# Altium integrated library Samtec 2 mm Pitch Terminal Strips.IntLib: 623 symbols (part 3 of 5) (continued)
## TMMH-136-01-L-D-ES
designator P?
Flexible Through-Hole Header, Vertical, -55 to 125 degC, 2 mm Pitch, 72-Pin, Male, RoHS; Manufacturer: Samtec; PartNumber: TMMH-136-01-L-D-ES; Pitch: 2 mm; DatasheetVersion: F-214; PackageVersion: AR, 12/1996; PackageReference: TMMH-136-01-X-D-ES; PackageDescription: 2mm x 2mm Terminal Strip Assembly; Orientation: Vertical; RoHS: True; Temperature Range: -55 to 125 degC; Mounting Technology: Through-hole; ComponentLink1Description: Manufacturer URL; ComponentLink1URL: http://www.samtec.com; ComponentLink2Description: Datasheet; ComponentLink2URL: http://d2a072wq521u33.cloudfront.net/catalog_english//TMMH_TH.PDF; ComponentLink3Description: Package Specification; ComponentLink3URL: http://www.samtec.com/documents/webfiles/cpdf/TMMH-1XX-XX-XX-D-XXX-XXX-MKT1.pdf
footprint SMTC-TMMH-136-01-X-D-ES (Terminal Strip Assembly, 2x36 Pins, Vertical, 2mm Pitch, Male)
pins: 1, 2, 3, 4, 5, 6, 7, 8, 9, 10, 11, 12, 13, 14, 15, 16, 17, 18, 19, 20, 21, 22, 23, 24, 25, 26, 27, 28, 29, 30, 31, 32, 33, 34, 35, 36, 37, 38, 39, 40, 41, 42, 43, 44, 45, 46, 47, 48, 49, 50, 51, 52, 53, 54, 55, 56, 57, 58, 59, 60, 61, 62, 63, 64, 65, 66, 67, 68, 69, 70, 71, 72

## TMMH-136-01-T-D-ES
designator P?
Flexible Through-Hole Header, Vertical, -55 to 105 degC, 2 mm Pitch, 72-Pin, Male, RoHS; Manufacturer: Samtec; PartNumber: TMMH-136-01-T-D-ES; Pitch: 2 mm; DatasheetVersion: F-214; PackageVersion: AR, 12/1996; PackageReference: TMMH-136-01-X-D-ES; PackageDescription: 2mm x 2mm Terminal Strip Assembly; Orientation: Vertical; RoHS: True; Temperature Range: -55 to 105 degC; Mounting Technology: Through-hole; ComponentLink1Description: Manufacturer URL; ComponentLink1URL: http://www.samtec.com; ComponentLink2Description: Datasheet; ComponentLink2URL: http://d2a072wq521u33.cloudfront.net/catalog_english//TMMH_TH.PDF; ComponentLink3Description: Package Specification; ComponentLink3URL: http://www.samtec.com/documents/webfiles/cpdf/TMMH-1XX-XX-XX-D-XXX-XXX-MKT1.pdf
footprint SMTC-TMMH-136-01-X-D-ES (Terminal Strip Assembly, 2x36 Pins, Vertical, 2mm Pitch, Male)
pins: 1, 2, 3, 4, 5, 6, 7, 8, 9, 10, 11, 12, 13, 14, 15, 16, 17, 18, 19, 20, 21, 22, 23, 24, 25, 26, 27, 28, 29, 30, 31, 32, 33, 34, 35, 36, 37, 38, 39, 40, 41, 42, 43, 44, 45, 46, 47, 48, 49, 50, 51, 52, 53, 54, 55, 56, 57, 58, 59, 60, 61, 62, 63, 64, 65, 66, 67, 68, 69, 70, 71, 72

## TMMS-105-01-F-Q-RA-FS
designator P?
Shrouded Header, Through-Hole, Right Angle, -55 to 125 degC, 2 mm Pitch, 20-Pin, Male, RoHS; Manufacturer: Samtec; PartNumber: TMMS-105-01-F-Q-RA-FS; Pitch: 2 mm; DatasheetVersion: F-214; PackageVersion: G, 12/2002; PackageReference: TMMS-105-01-X-Q-RA-FS; PackageDescription: 2mm Quad Row Full Shroud Terminal ASM; Supplier 1: Newark; Supplier Part Number 1: 76P8860; Orientation: Right Angle; RoHS: True; Temperature Range: -55 to 125 degC; Mounting Technology: Through-hole; ComponentLink1Description: Manufacturer URL; ComponentLink1URL: http://www.samtec.com; ComponentLink2Description: Datasheet; ComponentLink2URL: http://d2a072wq521u33.cloudfront.net/catalog_english//tmms.pdf; ComponentLink3Description: Package Specification; ComponentLink3URL: http://www.samtec.com/documents/webfiles/cpdf/tmms-1xx-xx-xx-q-xx-fs-mkt.pdf
footprint SMTC-TMMS-105-01-X-Q-RA-FS (Full Shroud Terminal ASM, 4x5 Pins, Right Angle, 2mm Pitch, Male)
pins: 1, 2, 3, 4, 5, 6, 7, 8, 9, 10, 11, 12, 13, 14, 15, 16, 17, 18, 19, 20

## TMMS-105-01-L-Q-RA-FS
designator P?
Shrouded Header, Through-Hole, Right Angle, -55 to 125 degC, 2 mm Pitch, 20-Pin, Male, RoHS; Manufacturer: Samtec; PartNumber: TMMS-105-01-L-Q-RA-FS; Pitch: 2 mm; DatasheetVersion: F-214; PackageVersion: G, 12/2002; PackageReference: TMMS-105-01-X-Q-RA-FS; PackageDescription: 2mm Quad Row Full Shroud Terminal ASM; Supplier 1: Newark; Supplier Part Number 1: 76P8869; Orientation: Right Angle; RoHS: True; Temperature Range: -55 to 125 degC; Mounting Technology: Through-hole; ComponentLink1Description: Manufacturer URL; ComponentLink1URL: http://www.samtec.com; ComponentLink2Description: Datasheet; ComponentLink2URL: http://d2a072wq521u33.cloudfront.net/catalog_english//tmms.pdf; ComponentLink3Description: Package Specification; ComponentLink3URL: http://www.samtec.com/documents/webfiles/cpdf/tmms-1xx-xx-xx-q-xx-fs-mkt.pdf
footprint SMTC-TMMS-105-01-X-Q-RA-FS (Full Shroud Terminal ASM, 4x5 Pins, Right Angle, 2mm Pitch, Male)
pins: 1, 2, 3, 4, 5, 6, 7, 8, 9, 10, 11, 12, 13, 14, 15, 16, 17, 18, 19, 20

## TMMS-110-01-F-Q-FS
designator P?
Shrouded Header, Through-Hole, Vertical, -55 to 125 degC, 2 mm Pitch, 40-Pin, Male, RoHS; Manufacturer: Samtec; PartNumber: TMMS-110-01-F-Q-FS; Pitch: 2 mm; DatasheetVersion: F-214; PackageVersion: G, 12/2002; PackageReference: TMMS-110-01-X-Q-FS; PackageDescription: 2mm Quad Row Full Shroud Terminal ASM; Supplier 1: Newark; Supplier Part Number 1: 76P8895; Orientation: Vertical; RoHS: True; Temperature Range: -55 to 125 degC; Mounting Technology: Through-hole; ComponentLink1Description: Manufacturer URL; ComponentLink1URL: http://www.samtec.com; ComponentLink2Description: Datasheet; ComponentLink2URL: http://d2a072wq521u33.cloudfront.net/catalog_english//tmms.pdf; ComponentLink3Description: Package Specification; ComponentLink3URL: http://www.samtec.com/documents/webfiles/cpdf/tmms-1xx-xx-xx-q-xx-fs-mkt.pdf
footprint SMTC-TMMS-110-01-X-Q-FS (Full Shroud Terminal ASM, 4x10 Pins, Vertical, 2mm Pitch, Male)
pins: 1, 2, 3, 4, 5, 6, 7, 8, 9, 10, 11, 12, 13, 14, 15, 16, 17, 18, 19, 20, 21, 22, 23, 24, 25, 26, 27, 28, 29, 30, 31, 32, 33, 34, 35, 36, 37, 38, 39, 40

## TMMS-110-01-F-Q-RA
designator P?
Shrouded Header, Through-Hole, Right Angle, -55 to 125 degC, 2 mm Pitch, 40-Pin, Male, RoHS; Manufacturer: Samtec; PartNumber: TMMS-110-01-F-Q-RA; Pitch: 2 mm; DatasheetVersion: F-214; PackageVersion: G, 12/2002; PackageReference: TMMS-110-01-X-Q-RA; PackageDescription: 2mm Quad Row Full Shroud Terminal ASM; Supplier 1: Newark; Supplier Part Number 1: 76P8896; Orientation: Right Angle; RoHS: True; Temperature Range: -55 to 125 degC; Mounting Technology: Through-hole; ComponentLink1Description: Manufacturer URL; ComponentLink1URL: http://www.samtec.com; ComponentLink2Description: Datasheet; ComponentLink2URL: http://d2a072wq521u33.cloudfront.net/catalog_english//tmms.pdf; ComponentLink3Description: Package Specification; ComponentLink3URL: http://www.samtec.com/documents/webfiles/cpdf/tmms-1xx-xx-xx-q-xx-fs-mkt.pdf
footprint SMTC-TMMS-110-01-X-Q-RA (Full Shroud Terminal ASM, 4x10 Pins, Right Angle, 2mm Pitch, Male)
pins: 1, 2, 3, 4, 5, 6, 7, 8, 9, 10, 11, 12, 13, 14, 15, 16, 17, 18, 19, 20, 21, 22, 23, 24, 25, 26, 27, 28, 29, 30, 31, 32, 33, 34, 35, 36, 37, 38, 39, 40

## TMMS-110-01-L-Q-FS
designator P?
Shrouded Header, Through-Hole, Vertical, -55 to 125 degC, 2 mm Pitch, 40-Pin, Male, RoHS; Manufacturer: Samtec; PartNumber: TMMS-110-01-L-Q-FS; Pitch: 2 mm; DatasheetVersion: F-214; PackageVersion: G, 12/2002; PackageReference: TMMS-110-01-X-Q-FS; PackageDescription: 2mm Quad Row Full Shroud Terminal ASM; Supplier 1: Newark; Supplier Part Number 1: 76P8903; Orientation: Vertical; RoHS: True; Temperature Range: -55 to 125 degC; Mounting Technology: Through-hole; ComponentLink1Description: Manufacturer URL; ComponentLink1URL: http://www.samtec.com; ComponentLink2Description: Datasheet; ComponentLink2URL: http://d2a072wq521u33.cloudfront.net/catalog_english//tmms.pdf; ComponentLink3Description: Package Specification; ComponentLink3URL: http://www.samtec.com/documents/webfiles/cpdf/tmms-1xx-xx-xx-q-xx-fs-mkt.pdf
footprint SMTC-TMMS-110-01-X-Q-FS (Full Shroud Terminal ASM, 4x10 Pins, Vertical, 2mm Pitch, Male)
pins: 1, 2, 3, 4, 5, 6, 7, 8, 9, 10, 11, 12, 13, 14, 15, 16, 17, 18, 19, 20, 21, 22, 23, 24, 25, 26, 27, 28, 29, 30, 31, 32, 33, 34, 35, 36, 37, 38, 39, 40

## TMMS-110-01-L-Q-RA
designator P?
Shrouded Header, Through-Hole, Right Angle, -55 to 125 degC, 2 mm Pitch, 40-Pin, Male, RoHS; Manufacturer: Samtec; PartNumber: TMMS-110-01-L-Q-RA; Pitch: 2 mm; DatasheetVersion: F-214; PackageVersion: G, 12/2002; PackageReference: TMMS-110-01-X-Q-RA; PackageDescription: 2mm Quad Row Full Shroud Terminal ASM; Supplier 1: Newark; Supplier Part Number 1: 76P8904; Orientation: Right Angle; RoHS: True; Temperature Range: -55 to 125 degC; Mounting Technology: Through-hole; ComponentLink1Description: Manufacturer URL; ComponentLink1URL: http://www.samtec.com; ComponentLink2Description: Datasheet; ComponentLink2URL: http://d2a072wq521u33.cloudfront.net/catalog_english//tmms.pdf; ComponentLink3Description: Package Specification; ComponentLink3URL: http://www.samtec.com/documents/webfiles/cpdf/tmms-1xx-xx-xx-q-xx-fs-mkt.pdf
footprint SMTC-TMMS-110-01-X-Q-RA (Full Shroud Terminal ASM, 4x10 Pins, Right Angle, 2mm Pitch, Male)
pins: 1, 2, 3, 4, 5, 6, 7, 8, 9, 10, 11, 12, 13, 14, 15, 16, 17, 18, 19, 20, 21, 22, 23, 24, 25, 26, 27, 28, 29, 30, 31, 32, 33, 34, 35, 36, 37, 38, 39, 40

## TMMS-111-01-F-Q-FS
designator P?
Shrouded Header, Through-Hole, Vertical, -55 to 125 degC, 2 mm Pitch, 44-Pin, Male, RoHS; Manufacturer: Samtec; PartNumber: TMMS-111-01-F-Q-FS; Pitch: 2 mm; DatasheetVersion: F-214; PackageVersion: G, 12/2002; PackageReference: TMMS-111-01-X-Q-FS; PackageDescription: 2mm Quad Row Full Shroud Terminal ASM; Orientation: Vertical; RoHS: True; Temperature Range: -55 to 125 degC; Mounting Technology: Through-hole; ComponentLink1Description: Manufacturer URL; ComponentLink1URL: http://www.samtec.com; ComponentLink2Description: Datasheet; ComponentLink2URL: http://d2a072wq521u33.cloudfront.net/catalog_english//tmms.pdf; ComponentLink3Description: Package Specification; ComponentLink3URL: http://www.samtec.com/documents/webfiles/cpdf/tmms-1xx-xx-xx-q-xx-fs-mkt.pdf
footprint SMTC-TMMS-111-01-X-Q-FS (Full Shroud Terminal ASM, 4x11 Pins, Vertical, 2mm Pitch, Male)
pins: 1, 2, 3, 4, 5, 6, 7, 8, 9, 10, 11, 12, 13, 14, 15, 16, 17, 18, 19, 20, 21, 22, 23, 24, 25, 26, 27, 28, 29, 30, 31, 32, 33, 34, 35, 36, 37, 38, 39, 40, 41, 42, 43, 44

## TMMS-111-01-L-Q-FS
designator P?
Shrouded Header, Through-Hole, Vertical, -55 to 125 degC, 2 mm Pitch, 44-Pin, Male, RoHS; Manufacturer: Samtec; PartNumber: TMMS-111-01-L-Q-FS; Pitch: 2 mm; DatasheetVersion: F-214; PackageVersion: G, 12/2002; PackageReference: TMMS-111-01-X-Q-FS; PackageDescription: 2mm Quad Row Full Shroud Terminal ASM; Orientation: Vertical; RoHS: True; Temperature Range: -55 to 125 degC; Mounting Technology: Through-hole; ComponentLink1Description: Manufacturer URL; ComponentLink1URL: http://www.samtec.com; ComponentLink2Description: Datasheet; ComponentLink2URL: http://d2a072wq521u33.cloudfront.net/catalog_english//tmms.pdf; ComponentLink3Description: Package Specification; ComponentLink3URL: http://www.samtec.com/documents/webfiles/cpdf/tmms-1xx-xx-xx-q-xx-fs-mkt.pdf
footprint SMTC-TMMS-111-01-X-Q-FS (Full Shroud Terminal ASM, 4x11 Pins, Vertical, 2mm Pitch, Male)
pins: 1, 2, 3, 4, 5, 6, 7, 8, 9, 10, 11, 12, 13, 14, 15, 16, 17, 18, 19, 20, 21, 22, 23, 24, 25, 26, 27, 28, 29, 30, 31, 32, 33, 34, 35, 36, 37, 38, 39, 40, 41, 42, 43, 44

## TMMS-125-01-F-Q-FS
designator P?
Shrouded Header, Through-Hole, Vertical, -55 to 125 degC, 2 mm Pitch, 100-Pin, Male, RoHS; Manufacturer: Samtec; PartNumber: TMMS-125-01-F-Q-FS; Pitch: 2 mm; DatasheetVersion: F-214; PackageVersion: G, 12/2002; PackageReference: TMMS-125-01-X-Q-FS; PackageDescription: 2mm Quad Row Full Shroud Terminal ASM; Orientation: Vertical; RoHS: True; Temperature Range: -55 to 125 degC; Mounting Technology: Through-hole; ComponentLink1Description: Manufacturer URL; ComponentLink1URL: http://www.samtec.com; ComponentLink2Description: Datasheet; ComponentLink2URL: http://d2a072wq521u33.cloudfront.net/catalog_english//tmms.pdf; ComponentLink3Description: Package Specification; ComponentLink3URL: http://www.samtec.com/documents/webfiles/cpdf/tmms-1xx-xx-xx-q-xx-fs-mkt.pdf
footprint SMTC-TMMS-125-01-X-Q-FS (Full Shroud Terminal ASM, 4x25 Pins, Vertical, 2mm Pitch, Male)
pins: 1, 2, 3, 4, 5, 6, 7, 8, 9, 10, 11, 12, 13, 14, 15, 16, 17, 18, 19, 20, 21, 22, 23, 24, 25, 26, 27, 28, 29, 30, 31, 32, 33, 34, 35, 36, 37, 38, 39, 40, 41, 42, 43, 44, 45, 46, 47, 48, 49, 50, 51, 52, 53, 54, 55, 56, 57, 58, 59, 60, 61, 62, 63, 64, 65, 66, 67, 68, 69, 70, 71, 72, 73, 74, 75, 76, 77, 78, 79, 80, 81, 82, 83, 84, 85, 86, 87, 88, 89, 90, 91, 92, 93, 94, 95, 96, 97, 98, 99, 100

## TMMS-125-01-F-Q-RA-FS
designator P?
Shrouded Header, Through-Hole, Right Angle, -55 to 125 degC, 2 mm Pitch, 100-Pin, Male, RoHS; Manufacturer: Samtec; PartNumber: TMMS-125-01-F-Q-RA-FS; Pitch: 2 mm; DatasheetVersion: F-214; PackageVersion: G, 12/2002; PackageReference: TMMS-125-01-X-Q-RA-FS; PackageDescription: 2mm Quad Row Full Shroud Terminal ASM; Orientation: Right Angle; RoHS: True; Temperature Range: -55 to 125 degC; Mounting Technology: Through-hole; ComponentLink1Description: Manufacturer URL; ComponentLink1URL: http://www.samtec.com; ComponentLink2Description: Datasheet; ComponentLink2URL: http://d2a072wq521u33.cloudfront.net/catalog_english//tmms.pdf; ComponentLink3Description: Package Specification; ComponentLink3URL: http://www.samtec.com/documents/webfiles/cpdf/tmms-1xx-xx-xx-q-xx-fs-mkt.pdf
footprint SMTC-TMMS-125-01-X-Q-RA-FS (Full Shroud Terminal ASM, 4x25 Pins, Right Angle, 2mm Pitch, Male)
pins: 1, 2, 3, 4, 5, 6, 7, 8, 9, 10, 11, 12, 13, 14, 15, 16, 17, 18, 19, 20, 21, 22, 23, 24, 25, 26, 27, 28, 29, 30, 31, 32, 33, 34, 35, 36, 37, 38, 39, 40, 41, 42, 43, 44, 45, 46, 47, 48, 49, 50, 51, 52, 53, 54, 55, 56, 57, 58, 59, 60, 61, 62, 63, 64, 65, 66, 67, 68, 69, 70, 71, 72, 73, 74, 75, 76, 77, 78, 79, 80, 81, 82, 83, 84, 85, 86, 87, 88, 89, 90, 91, 92, 93, 94, 95, 96, 97, 98, 99, 100

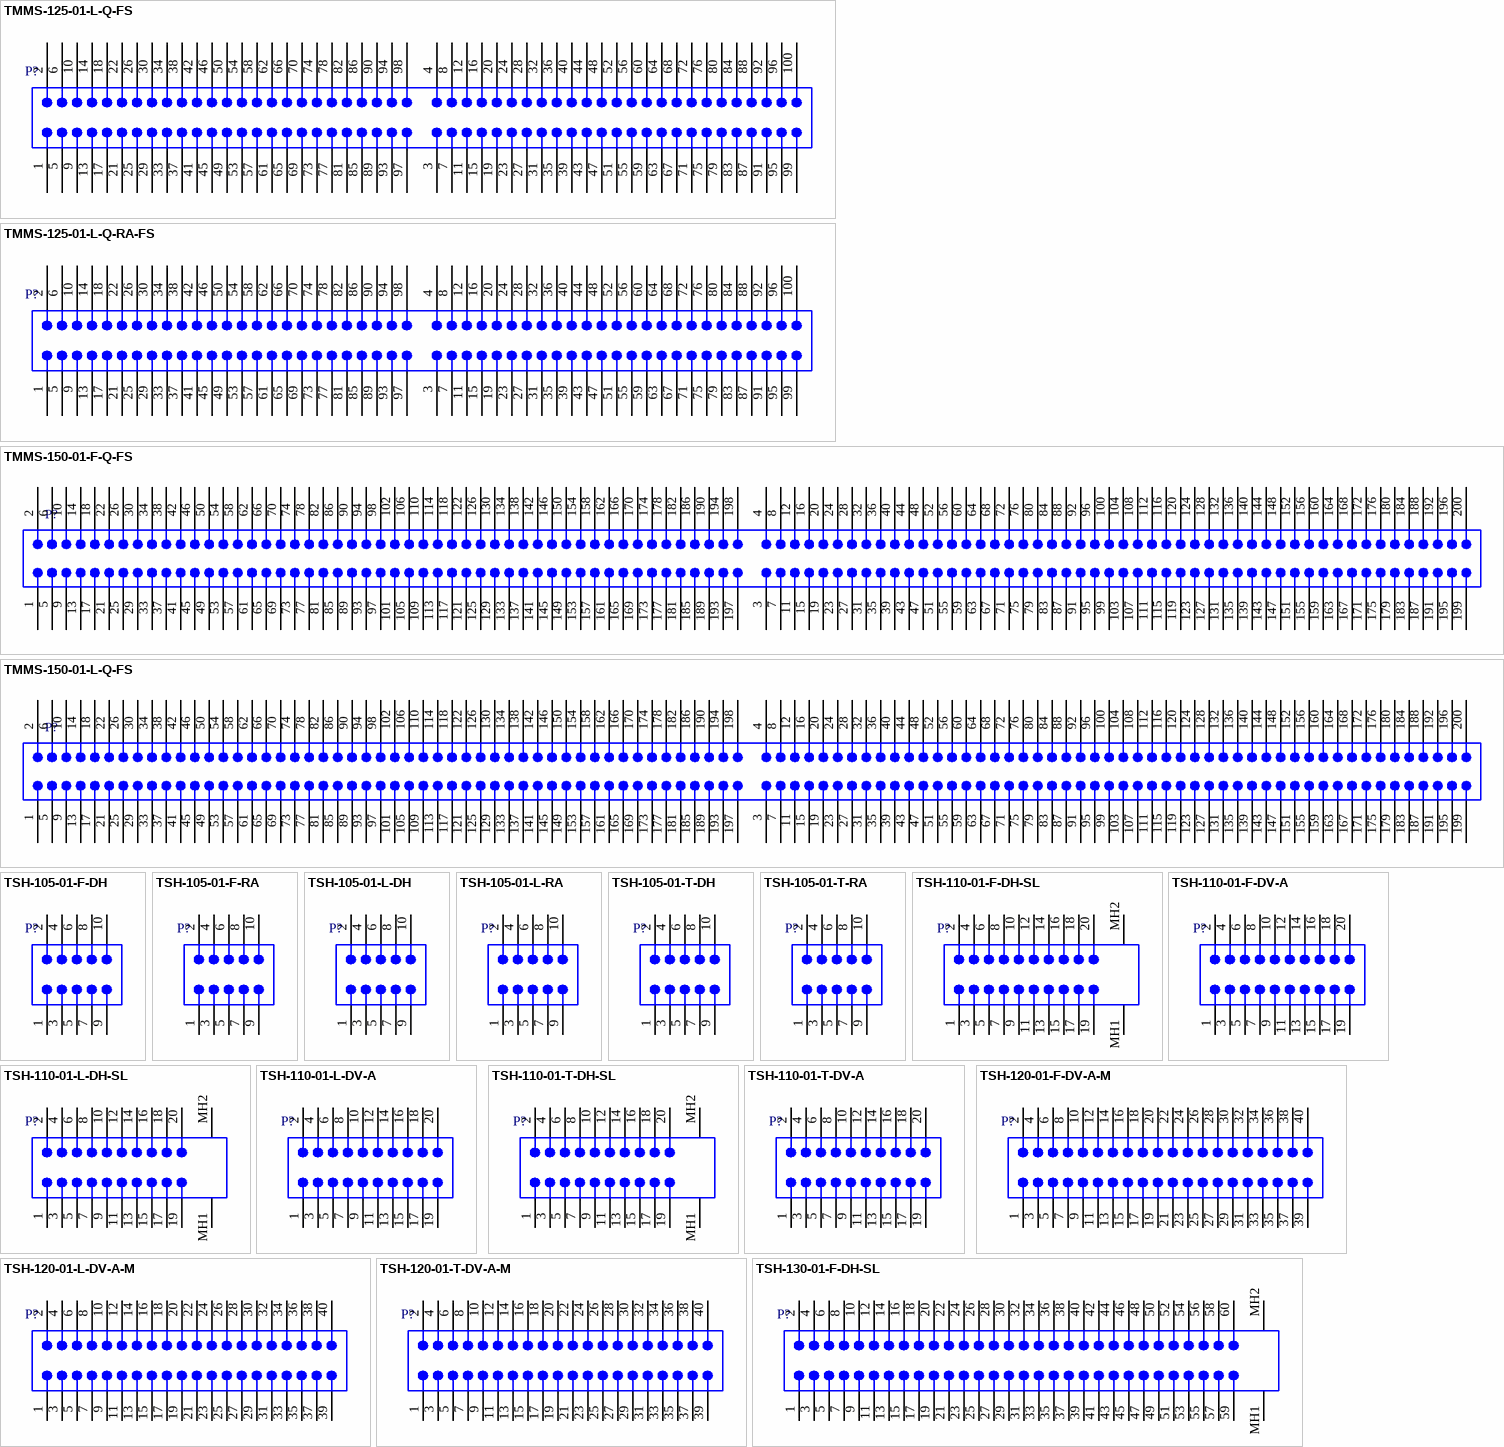
[diagram p8: symbols TMMS-125-01-L-Q-FS to TSH-130-01-F-DH-SL]

## TMMS-125-01-L-Q-FS
designator P?
Shrouded Header, Through-Hole, Vertical, -55 to 125 degC, 2 mm Pitch, 100-Pin, Male, RoHS; Manufacturer: Samtec; PartNumber: TMMS-125-01-L-Q-FS; Pitch: 2 mm; DatasheetVersion: F-214; PackageVersion: G, 12/2002; PackageReference: TMMS-125-01-X-Q-FS; PackageDescription: 2mm Quad Row Full Shroud Terminal ASM; Orientation: Vertical; RoHS: True; Temperature Range: -55 to 125 degC; Mounting Technology: Through-hole; ComponentLink1Description: Manufacturer URL; ComponentLink1URL: http://www.samtec.com; ComponentLink2Description: Datasheet; ComponentLink2URL: http://d2a072wq521u33.cloudfront.net/catalog_english//tmms.pdf; ComponentLink3Description: Package Specification; ComponentLink3URL: http://www.samtec.com/documents/webfiles/cpdf/tmms-1xx-xx-xx-q-xx-fs-mkt.pdf
footprint SMTC-TMMS-125-01-X-Q-FS (Full Shroud Terminal ASM, 4x25 Pins, Vertical, 2mm Pitch, Male)
pins: 1, 2, 3, 4, 5, 6, 7, 8, 9, 10, 11, 12, 13, 14, 15, 16, 17, 18, 19, 20, 21, 22, 23, 24, 25, 26, 27, 28, 29, 30, 31, 32, 33, 34, 35, 36, 37, 38, 39, 40, 41, 42, 43, 44, 45, 46, 47, 48, 49, 50, 51, 52, 53, 54, 55, 56, 57, 58, 59, 60, 61, 62, 63, 64, 65, 66, 67, 68, 69, 70, 71, 72, 73, 74, 75, 76, 77, 78, 79, 80, 81, 82, 83, 84, 85, 86, 87, 88, 89, 90, 91, 92, 93, 94, 95, 96, 97, 98, 99, 100

## TMMS-125-01-L-Q-RA-FS
designator P?
Shrouded Header, Through-Hole, Right Angle, -55 to 125 degC, 2 mm Pitch, 100-Pin, Male, RoHS; Manufacturer: Samtec; PartNumber: TMMS-125-01-L-Q-RA-FS; Pitch: 2 mm; DatasheetVersion: F-214; PackageVersion: G, 12/2002; PackageReference: TMMS-125-01-X-Q-RA-FS; PackageDescription: 2mm Quad Row Full Shroud Terminal ASM; Orientation: Right Angle; RoHS: True; Temperature Range: -55 to 125 degC; Mounting Technology: Through-hole; ComponentLink1Description: Manufacturer URL; ComponentLink1URL: http://www.samtec.com; ComponentLink2Description: Datasheet; ComponentLink2URL: http://d2a072wq521u33.cloudfront.net/catalog_english//tmms.pdf; ComponentLink3Description: Package Specification; ComponentLink3URL: http://www.samtec.com/documents/webfiles/cpdf/tmms-1xx-xx-xx-q-xx-fs-mkt.pdf
footprint SMTC-TMMS-125-01-X-Q-RA-FS (Full Shroud Terminal ASM, 4x25 Pins, Right Angle, 2mm Pitch, Male)
pins: 1, 2, 3, 4, 5, 6, 7, 8, 9, 10, 11, 12, 13, 14, 15, 16, 17, 18, 19, 20, 21, 22, 23, 24, 25, 26, 27, 28, 29, 30, 31, 32, 33, 34, 35, 36, 37, 38, 39, 40, 41, 42, 43, 44, 45, 46, 47, 48, 49, 50, 51, 52, 53, 54, 55, 56, 57, 58, 59, 60, 61, 62, 63, 64, 65, 66, 67, 68, 69, 70, 71, 72, 73, 74, 75, 76, 77, 78, 79, 80, 81, 82, 83, 84, 85, 86, 87, 88, 89, 90, 91, 92, 93, 94, 95, 96, 97, 98, 99, 100

## TMMS-150-01-F-Q-FS
designator P?
Shrouded Header, Through-Hole, Vertical, -55 to 125 degC, 2 mm Pitch, 200-Pin, Male, RoHS; Manufacturer: Samtec; PartNumber: TMMS-150-01-F-Q-FS; Pitch: 2 mm; DatasheetVersion: F-214; PackageVersion: G, 12/2002; PackageReference: TMMS-150-01-X-Q-FS; PackageDescription: 2mm Quad Row Full Shroud Terminal ASM; Supplier 1: Newark; Supplier Part Number 1: 76P9065; Orientation: Vertical; RoHS: True; Temperature Range: -55 to 125 degC; Mounting Technology: Through-hole; ComponentLink1Description: Manufacturer URL; ComponentLink1URL: http://www.samtec.com; ComponentLink2Description: Datasheet; ComponentLink2URL: http://d2a072wq521u33.cloudfront.net/catalog_english//tmms.pdf; ComponentLink3Description: Package Specification; ComponentLink3URL: http://www.samtec.com/documents/webfiles/cpdf/tmms-1xx-xx-xx-q-xx-fs-mkt.pdf
footprint SMTC-TMMS-150-01-X-Q-FS (Full Shroud Terminal ASM, 4x50 Pins, Vertical, 2mm Pitch, Male)
pins: 1, 2, 3, 4, 5, 6, 7, 8, 9, 10, 11, 12, 13, 14, 15, 16, 17, 18, 19, 20, 21, 22, 23, 24, 25, 26, 27, 28, 29, 30, 31, 32, 33, 34, 35, 36, 37, 38, 39, 40, 41, 42, 43, 44, 45, 46, 47, 48, 49, 50, 51, 52, 53, 54, 55, 56, 57, 58, 59, 60, 61, 62, 63, 64, 65, 66, 67, 68, 69, 70, 71, 72, 73, 74, 75, 76, 77, 78, 79, 80, 81, 82, 83, 84, 85, 86, 87, 88, 89, 90, 91, 92, 93, 94, 95, 96, 97, 98, 99, 100, 101, 102, 103, 104, 105, 106, 107, 108, 109, 110, 111, 112, 113, 114, 115, 116, 117, 118, 119, 120, 121, 122, 123, 124, 125, 126, 127, 128, 129, 130, 131, 132, 133, 134, 135, 136, 137, 138, 139, 140, 141, 142, 143, 144, 145, 146, 147, 148, 149, 150, 151, 152, 153, 154, 155, 156, 157, 158, 159, 160, 161, 162, 163, 164, 165, 166, 167, 168, 169, 170, 171, 172, 173, 174, 175, 176, 177, 178, 179, 180, 181, 182, 183, 184, 185, 186, 187, 188, 189, 190, 191, 192, 193, 194, 195, 196, 197, 198, 199, 200

## TMMS-150-01-L-Q-FS
designator P?
Shrouded Header, Through-Hole, Vertical, -55 to 125 degC, 2 mm Pitch, 200-Pin, Male, RoHS; Manufacturer: Samtec; PartNumber: TMMS-150-01-L-Q-FS; Pitch: 2 mm; DatasheetVersion: F-214; PackageVersion: G, 12/2002; PackageReference: TMMS-150-01-X-Q-FS; PackageDescription: 2mm Quad Row Full Shroud Terminal ASM; Supplier 1: Newark; Supplier Part Number 1: 76P9074; Orientation: Vertical; RoHS: True; Temperature Range: -55 to 125 degC; Mounting Technology: Through-hole; ComponentLink1Description: Manufacturer URL; ComponentLink1URL: http://www.samtec.com; ComponentLink2Description: Datasheet; ComponentLink2URL: http://d2a072wq521u33.cloudfront.net/catalog_english//tmms.pdf; ComponentLink3Description: Package Specification; ComponentLink3URL: http://www.samtec.com/documents/webfiles/cpdf/tmms-1xx-xx-xx-q-xx-fs-mkt.pdf
footprint SMTC-TMMS-150-01-X-Q-FS (Full Shroud Terminal ASM, 4x50 Pins, Vertical, 2mm Pitch, Male)
pins: 1, 2, 3, 4, 5, 6, 7, 8, 9, 10, 11, 12, 13, 14, 15, 16, 17, 18, 19, 20, 21, 22, 23, 24, 25, 26, 27, 28, 29, 30, 31, 32, 33, 34, 35, 36, 37, 38, 39, 40, 41, 42, 43, 44, 45, 46, 47, 48, 49, 50, 51, 52, 53, 54, 55, 56, 57, 58, 59, 60, 61, 62, 63, 64, 65, 66, 67, 68, 69, 70, 71, 72, 73, 74, 75, 76, 77, 78, 79, 80, 81, 82, 83, 84, 85, 86, 87, 88, 89, 90, 91, 92, 93, 94, 95, 96, 97, 98, 99, 100, 101, 102, 103, 104, 105, 106, 107, 108, 109, 110, 111, 112, 113, 114, 115, 116, 117, 118, 119, 120, 121, 122, 123, 124, 125, 126, 127, 128, 129, 130, 131, 132, 133, 134, 135, 136, 137, 138, 139, 140, 141, 142, 143, 144, 145, 146, 147, 148, 149, 150, 151, 152, 153, 154, 155, 156, 157, 158, 159, 160, 161, 162, 163, 164, 165, 166, 167, 168, 169, 170, 171, 172, 173, 174, 175, 176, 177, 178, 179, 180, 181, 182, 183, 184, 185, 186, 187, 188, 189, 190, 191, 192, 193, 194, 195, 196, 197, 198, 199, 200

## TSH-105-01-F-DH
designator P?
Shrouded Header, Surface Mount, Horizontal, -55 to 125 degC, 2 mm Pitch, 10-Pin, Male, RoHS; Manufacturer: Samtec; PartNumber: TSH-105-01-F-DH; Pitch: 2 mm; DatasheetVersion: F-214; PackageVersion: W, 9/1999; PackageReference: TSH-105-01-X-DH; PackageDescription: 2mm Horizontal Mount Terminal Strip Assembly; Supplier 1: Newark; Supplier Part Number 1: 77P3711; Orientation: Horizontal; RoHS: True; Temperature Range: -55 to 125 degC; Mounting Technology: Surface Mount; ComponentLink1Description: Manufacturer URL; ComponentLink1URL: http://www.samtec.com; ComponentLink2Description: Datasheet; ComponentLink2URL: http://d2a072wq521u33.cloudfront.net/catalog_english//TSH.PDF; ComponentLink3Description: Package Specification; ComponentLink3URL: http://www.samtec.com/documents/webfiles/cpdf/TSH-1XX-XX-XX-XX-XX-MKT.pdf
footprint SMTC-TSH-105-01-X-DH (Terminal Strip Assembly, 2x5 Pins, Horizontal, 2mm Pitch, Male)
pins: 1, 2, 3, 4, 5, 6, 7, 8, 9, 10

## TSH-105-01-F-RA
designator P?
Shrouded Header, Through-Hole, Right Angle, -55 to 125 degC, 2 mm Pitch, 10-Pin, Male, RoHS; Manufacturer: Samtec; PartNumber: TSH-105-01-F-RA; Pitch: 2 mm; DatasheetVersion: F-214; PackageVersion: W, 9/1999; PackageReference: TSH-105-01-X-RA; PackageDescription: 2mm Horizontal Mount Terminal Strip Assembly; Supplier 1: Newark; Supplier Part Number 1: 77P3721; Orientation: Right Angle; RoHS: True; Temperature Range: -55 to 125 degC; Mounting Technology: Through-hole; ComponentLink1Description: Manufacturer URL; ComponentLink1URL: http://www.samtec.com; ComponentLink2Description: Datasheet; ComponentLink2URL: http://d2a072wq521u33.cloudfront.net/catalog_english//TSH.PDF; ComponentLink3Description: Package Specification; ComponentLink3URL: http://www.samtec.com/documents/webfiles/cpdf/TSH-1XX-XX-XX-XX-XX-MKT.pdf
footprint SMTC-TSH-105-01-X-RA (Terminal Strip Assembly, 2x5 Pins, Right Angle, 2mm Pitch, Male)
pins: 1, 2, 3, 4, 5, 6, 7, 8, 9, 10

## TSH-105-01-L-DH
designator P?
Shrouded Header, Surface Mount, Horizontal, -55 to 125 degC, 2 mm Pitch, 10-Pin, Male, RoHS; Manufacturer: Samtec; PartNumber: TSH-105-01-L-DH; Pitch: 2 mm; DatasheetVersion: F-214; PackageVersion: W, 9/1999; PackageReference: TSH-105-01-X-DH; PackageDescription: 2mm Horizontal Mount Terminal Strip Assembly; Supplier 1: Newark; Supplier Part Number 1: 77P3731; Orientation: Horizontal; RoHS: True; Temperature Range: -55 to 125 degC; Mounting Technology: Surface Mount; ComponentLink1Description: Manufacturer URL; ComponentLink1URL: http://www.samtec.com; ComponentLink2Description: Datasheet; ComponentLink2URL: http://d2a072wq521u33.cloudfront.net/catalog_english//TSH.PDF; ComponentLink3Description: Package Specification; ComponentLink3URL: http://www.samtec.com/documents/webfiles/cpdf/TSH-1XX-XX-XX-XX-XX-MKT.pdf
footprint SMTC-TSH-105-01-X-DH (Terminal Strip Assembly, 2x5 Pins, Horizontal, 2mm Pitch, Male)
pins: 1, 2, 3, 4, 5, 6, 7, 8, 9, 10

## TSH-105-01-L-RA
designator P?
Shrouded Header, Through-Hole, Right Angle, -55 to 125 degC, 2 mm Pitch, 10-Pin, Male, RoHS; Manufacturer: Samtec; PartNumber: TSH-105-01-L-RA; Pitch: 2 mm; DatasheetVersion: F-214; PackageVersion: W, 9/1999; PackageReference: TSH-105-01-X-RA; PackageDescription: 2mm Horizontal Mount Terminal Strip Assembly; Supplier 1: Newark; Supplier Part Number 1: 77P3743; Orientation: Right Angle; RoHS: True; Temperature Range: -55 to 125 degC; Mounting Technology: Through-hole; ComponentLink1Description: Manufacturer URL; ComponentLink1URL: http://www.samtec.com; ComponentLink2Description: Datasheet; ComponentLink2URL: http://d2a072wq521u33.cloudfront.net/catalog_english//TSH.PDF; ComponentLink3Description: Package Specification; ComponentLink3URL: http://www.samtec.com/documents/webfiles/cpdf/TSH-1XX-XX-XX-XX-XX-MKT.pdf
footprint SMTC-TSH-105-01-X-RA (Terminal Strip Assembly, 2x5 Pins, Right Angle, 2mm Pitch, Male)
pins: 1, 2, 3, 4, 5, 6, 7, 8, 9, 10

## TSH-105-01-T-DH
designator P?
Shrouded Header, Surface Mount, Horizontal, -55 to 105 degC, 2 mm Pitch, 10-Pin, Male, RoHS; Manufacturer: Samtec; PartNumber: TSH-105-01-T-DH; Pitch: 2 mm; DatasheetVersion: F-214; PackageVersion: W, 9/1999; PackageReference: TSH-105-01-X-DH; PackageDescription: 2mm Horizontal Mount Terminal Strip Assembly; Supplier 1: Newark; Supplier Part Number 1: 77P3767; Orientation: Horizontal; RoHS: True; Temperature Range: -55 to 105 degC; Mounting Technology: Surface Mount; ComponentLink1Description: Manufacturer URL; ComponentLink1URL: http://www.samtec.com; ComponentLink2Description: Datasheet; ComponentLink2URL: http://d2a072wq521u33.cloudfront.net/catalog_english//TSH.PDF; ComponentLink3Description: Package Specification; ComponentLink3URL: http://www.samtec.com/documents/webfiles/cpdf/TSH-1XX-XX-XX-XX-XX-MKT.pdf
footprint SMTC-TSH-105-01-X-DH (Terminal Strip Assembly, 2x5 Pins, Horizontal, 2mm Pitch, Male)
pins: 1, 2, 3, 4, 5, 6, 7, 8, 9, 10

## TSH-105-01-T-RA
designator P?
Shrouded Header, Through-Hole, Right Angle, -55 to 105 degC, 2 mm Pitch, 10-Pin, Male, RoHS; Manufacturer: Samtec; PartNumber: TSH-105-01-T-RA; Pitch: 2 mm; DatasheetVersion: F-214; PackageVersion: W, 9/1999; PackageReference: TSH-105-01-X-RA; PackageDescription: 2mm Horizontal Mount Terminal Strip Assembly; Supplier 1: Newark; Supplier Part Number 1: 77P3774; Orientation: Right Angle; RoHS: True; Temperature Range: -55 to 105 degC; Mounting Technology: Through-hole; ComponentLink1Description: Manufacturer URL; ComponentLink1URL: http://www.samtec.com; ComponentLink2Description: Datasheet; ComponentLink2URL: http://d2a072wq521u33.cloudfront.net/catalog_english//TSH.PDF; ComponentLink3Description: Package Specification; ComponentLink3URL: http://www.samtec.com/documents/webfiles/cpdf/TSH-1XX-XX-XX-XX-XX-MKT.pdf
footprint SMTC-TSH-105-01-X-RA (Terminal Strip Assembly, 2x5 Pins, Right Angle, 2mm Pitch, Male)
pins: 1, 2, 3, 4, 5, 6, 7, 8, 9, 10

## TSH-110-01-F-DH-SL
designator P?
Shrouded Header, Surface Mount, Horizontal, -55 to 125 degC, 2 mm Pitch, 20-Pin, Male, RoHS; Manufacturer: Samtec; PartNumber: TSH-110-01-F-DH-SL; Pitch: 2 mm; DatasheetVersion: F-214; PackageVersion: W, 9/1999; PackageReference: TSH-110-01-X-DH-SL; PackageDescription: 2mm Horizontal Mount Terminal Strip Assembly; Supplier 1: Newark; Supplier Part Number 1: 77P3909; Orientation: Horizontal; RoHS: True; Temperature Range: -55 to 125 degC; Mounting Technology: Surface Mount; ComponentLink1Description: Manufacturer URL; ComponentLink1URL: http://www.samtec.com; ComponentLink2Description: Datasheet; ComponentLink2URL: http://d2a072wq521u33.cloudfront.net/catalog_english//TSH.PDF; ComponentLink3Description: Package Specification; ComponentLink3URL: http://www.samtec.com/documents/webfiles/cpdf/TSH-1XX-XX-XX-XX-XX-MKT.pdf
footprint SMTC-TSH-110-01-X-DH-SL (Terminal Strip Assembly, 2x10 Pins, Horizontal, 2mm Pitch, Male)
pins: 1, 2, 3, 4, 5, 6, 7, 8, 9, 10, 11, 12, 13, 14, 15, 16, 17, 18, 19, 20, MH1, MH2

## TSH-110-01-F-DV-A
designator P?
Shrouded Header, Surface Mount, Vertical, -55 to 125 degC, 2 mm Pitch, 20-Pin, Male, RoHS; Manufacturer: Samtec; PartNumber: TSH-110-01-F-DV-A; Pitch: 2 mm; DatasheetVersion: F-214; PackageVersion: R, 7/2010; PackageReference: TSH-110-01-X-DV-A; PackageDescription: 2mm End Shroud Terminal Assembly; Supplier 1: Newark; Supplier Part Number 1: 77P3915; Orientation: Vertical; RoHS: True; Temperature Range: -55 to 125 degC; Mounting Technology: Surface Mount; ComponentLink1Description: Manufacturer URL; ComponentLink1URL: http://www.samtec.com; ComponentLink2Description: Datasheet; ComponentLink2URL: http://d2a072wq521u33.cloudfront.net/catalog_english//TSH.PDF; ComponentLink3Description: Package Specification; ComponentLink3URL: http://www.samtec.com/documents/webfiles/cpdf/TSH-1XX-XX-XX-DX-XX-MKT.pdf
footprint SMTC-TSH-110-01-X-DV-A (Shroud Terminal Assembly, 2x10 Pins, Vertical, 2mm Pitch, Male)
pins: 1, 2, 3, 4, 5, 6, 7, 8, 9, 10, 11, 12, 13, 14, 15, 16, 17, 18, 19, 20

## TSH-110-01-L-DH-SL
designator P?
Shrouded Header, Surface Mount, Horizontal, -55 to 125 degC, 2 mm Pitch, 20-Pin, Male, RoHS; Manufacturer: Samtec; PartNumber: TSH-110-01-L-DH-SL; Pitch: 2 mm; DatasheetVersion: F-214; PackageVersion: W, 9/1999; PackageReference: TSH-110-01-X-DH-SL; PackageDescription: 2mm Horizontal Mount Terminal Strip Assembly; Supplier 1: Newark; Supplier Part Number 1: 77P3930; Orientation: Horizontal; RoHS: True; Temperature Range: -55 to 125 degC; Mounting Technology: Surface Mount; ComponentLink1Description: Manufacturer URL; ComponentLink1URL: http://www.samtec.com; ComponentLink2Description: Datasheet; ComponentLink2URL: http://d2a072wq521u33.cloudfront.net/catalog_english//TSH.PDF; ComponentLink3Description: Package Specification; ComponentLink3URL: http://www.samtec.com/documents/webfiles/cpdf/TSH-1XX-XX-XX-XX-XX-MKT.pdf
footprint SMTC-TSH-110-01-X-DH-SL (Terminal Strip Assembly, 2x10 Pins, Horizontal, 2mm Pitch, Male)
pins: 1, 2, 3, 4, 5, 6, 7, 8, 9, 10, 11, 12, 13, 14, 15, 16, 17, 18, 19, 20, MH1, MH2